# Altium footprint library con-amp.PCBLIB: 295 footprints (part 7 of 19)
Each footprint in its own frame and in the unit in brackets; x right, y up, seen from the top. Pads: shape width x height; smd on the part's side, far side on the other; paste and mask are expansions set on the pad; w line width, h text height; cw(c..) or ccw(c..) is an arc to the next point about the centre after c.
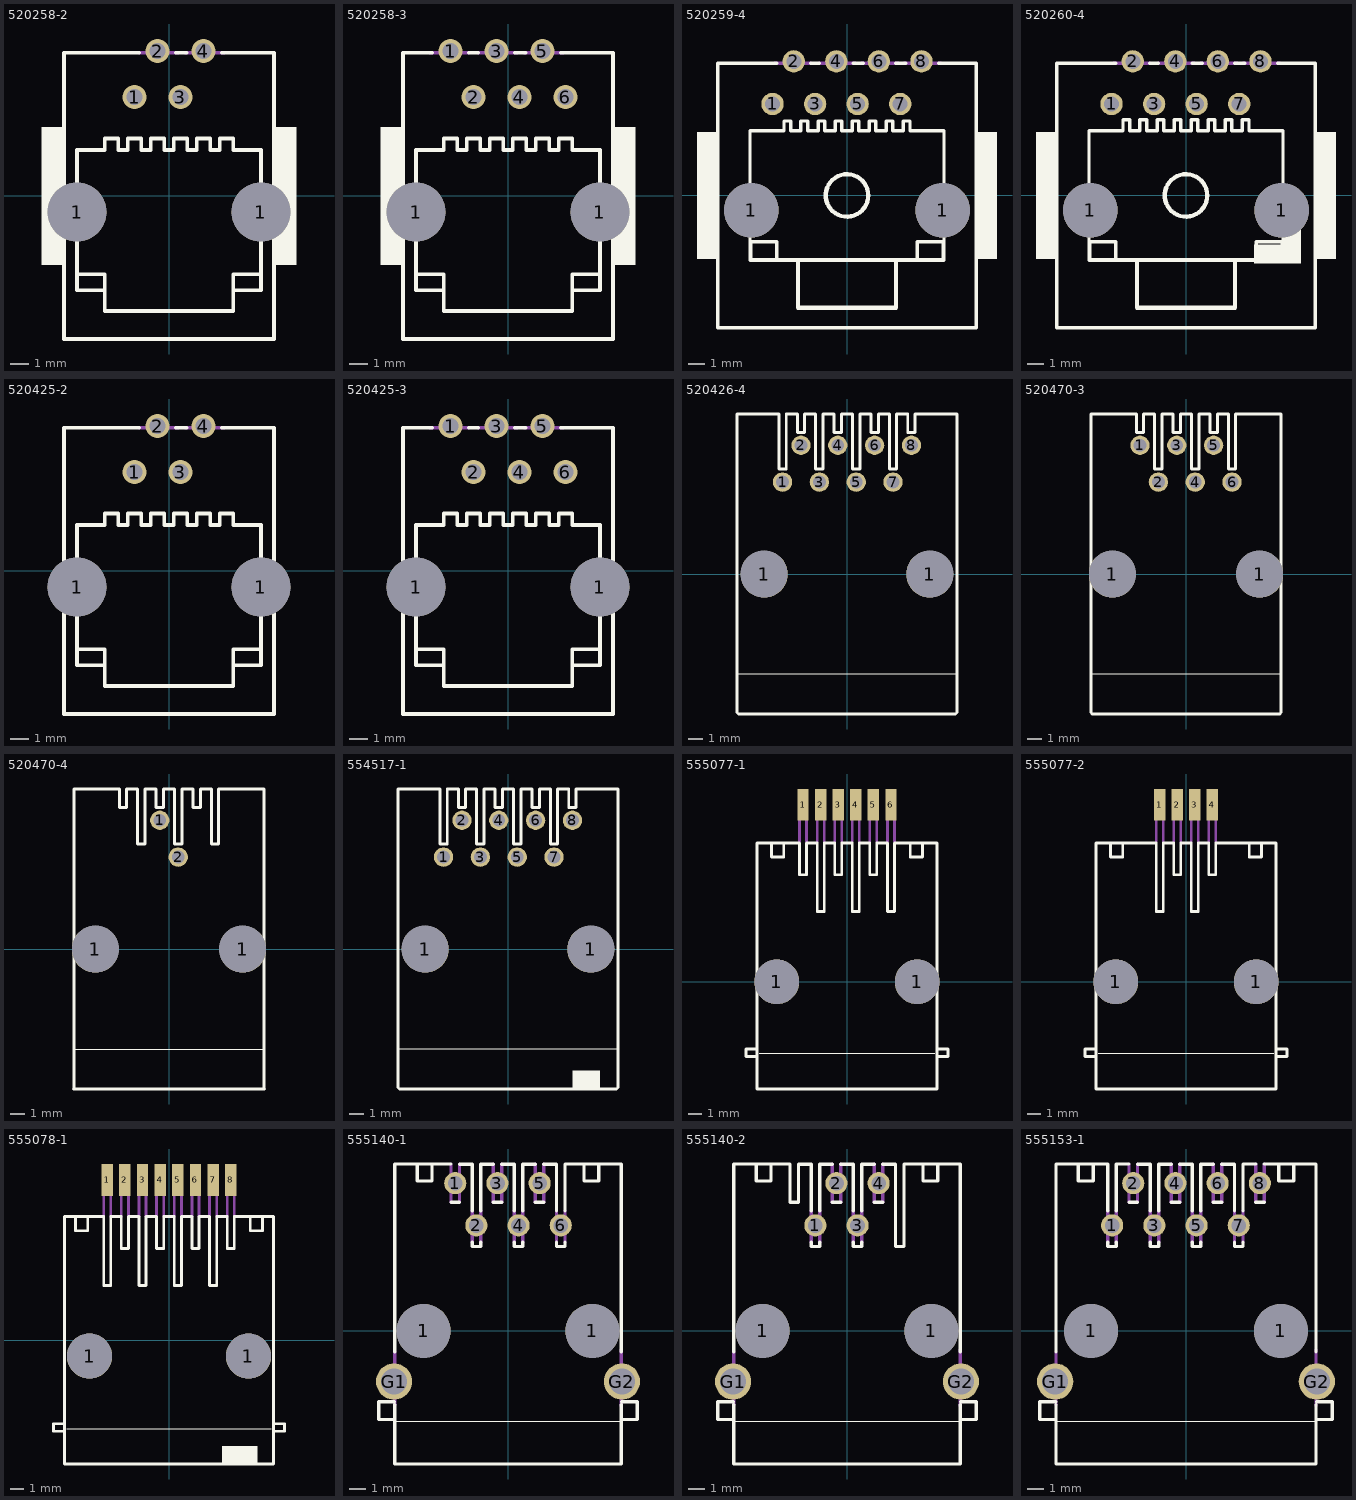
[diagram p6: the footprints below, top view; thin cyan lines are the x and y axes]

## 520258-2 [mil]
pads (6):
  round 128 hole 128: 1(-200,-35) 1(200,-35)
  round 52.5 hole 35: 1(-75,215) 2(-25,315) 3(25,215) 4(75,315)
Top Overlay:
  rectangle: -277.56,-149.61 -226.38,149.61
  rectangle: 226.38,-149.61 277.56,149.61
  lines w8: -65,311.02 -228.35,311.02 -228.35,-311.02 228.35,-311.02 228.35,311.02 115,311.02 ; 15,311.02 38.35,311.02 ; -200,-170 -200,100 -140,100 -140,125 -110,125 -110,100 -90,100 -90,125 -60,125 -60,100 -40,100 -40,125 -10,125 -10,100 10,100 10,125 40,125 40,100 60,100 60,125 90,125 90,100 110,100 110,125 140,125 140,100 200,100 200,-170 ; -200,-170 -200,-205 -140,-205 ; -200,-170 -140,-170 -140,-205 ; -140,-205 -140,-250 140,-250 140,-205 ; 140,-205 200,-205 200,-170 ; 140,-205 140,-170 200,-170
Mechanical 16:
  lines w8: -65,311.02 20,311.02 ; 35,311.02 120,311.02

## 520258-3 [mil]
pads (8):
  round 128 hole 128: 1(-200,-35) 1(200,-35)
  round 52.5 hole 35: 1(-125,315) 2(-75,215) 3(-25,315) 4(25,215) 5(75,315) 6(125,215)
Top Overlay:
  rectangle: -277.56,-149.61 -226.38,149.61
  rectangle: 226.38,-149.61 277.56,149.61
  lines w8: -165,311.02 -228.35,311.02 -228.35,-311.02 228.35,-311.02 228.35,311.02 115,311.02 ; -85,311.02 -65,311.02 ; 15,311.02 38.35,311.02 ; -200,-170 -200,100 -140,100 -140,125 -110,125 -110,100 -90,100 -90,125 -60,125 -60,100 -40,100 -40,125 -10,125 -10,100 10,100 10,125 40,125 40,100 60,100 60,125 90,125 90,100 110,100 110,125 140,125 140,100 200,100 200,-170 ; -200,-170 -200,-205 -140,-205 ; -200,-170 -140,-170 -140,-205 ; -140,-205 -140,-250 140,-250 140,-205 ; 140,-205 200,-205 200,-170 ; 140,-205 140,-170 200,-170
Mechanical 16:
  lines w8: -170,311.02 -85,311.02 ; -65,311.02 20,311.02 ; 35,311.02 120,311.02

## 520259-4 [mil]
pads (10):
  round 128 hole 128: 1(-225,-35) 1(225,-35)
  round 52.5 hole 35: 1(-175,215) 2(-125,315) 3(-75,215) 4(-25,315) 5(25,215) 6(75,315) 7(125,215) 8(175,315)
Top Overlay:
  circle w10: c0,0 r50
  rectangle: -352.56,-149.61 -301.38,149.61
  rectangle: 301.38,-149.61 352.56,149.61
  lines w8: -165,-152 -165,-109 -228,-109 -228,152 -148,152 -148,175 -132,175 -132,152 -109,152 -109,175 -92,175 -92,152 -68,152 -68,175 -52,175 -52,152 -28,152 -28,175 -12,175 -12,152 12,152 12,175 28,175 28,152 52,152 52,175 68,175 68,152 92,152 92,175 108,175 108,152 132,152 132,175 148,175 148,152 228,152 228,-109 165,-109 165,-152 ; -165,311.02 -303.35,311.02 -303.35,-311.02 303.35,-311.02 303.35,311.02 215,311.02 ; -85,311.02 -65,311.02 ; 15,311.02 38.35,311.02 ; 115,311.02 138.35,311.02
  lines w10: -227,-110 -227,-152 227,-152 227,-111 ; -115,-154 -115,-264 115,-264 115,-154
Mechanical 16:
  lines w8: -170,311.02 -85,311.02 ; -65,311.02 20,311.02 ; 35,311.02 120,311.02 ; 135,311.02 220,311.02

## 520260-4 [mil]
pads (10):
  round 128 hole 128: 1(-225,-35) 1(225,-35)
  round 52.5 hole 35: 1(-175,215) 2(-125,315) 3(-75,215) 4(-25,315) 5(25,215) 6(75,315) 7(125,215) 8(175,315)
Top Overlay:
  circle w10: c0,0 r50
  rectangle: -352.56,-149.61 -301.38,149.61
  rectangle: 301.38,-149.61 352.56,149.61
  rectangle: 160,-160 230,-115
  rectangle: 225,-160 270,-70
  lines w8: -165,-152 -165,-109 -228,-109 -228,152 -148,152 -148,178 -132,178 -132,152 -109,152 -109,178 -92,178 -92,152 -68,152 -68,178 -52,178 -52,152 -28,152 -28,178 -12,178 -12,152 12,152 12,178 28,178 28,152 52,152 52,178 68,178 68,152 92,152 92,178 108,178 108,152 132,152 132,178 148,178 148,152 228,152 228,-109 165,-109 165,-152 ; -165,311.02 -303.35,311.02 -303.35,-311.02 303.35,-311.02 303.35,311.02 215,311.02 ; -85,311.02 -65,311.02 ; 15,311.02 38.35,311.02 ; 115,311.02 138.35,311.02
  lines w10: -227,-110 -227,-152 227,-152 227,-111 ; -115,-154 -115,-264 115,-264 115,-154
Mechanical 16:
  lines w8: -170,311.02 -85,311.02 ; -65,311.02 20,311.02 ; 35,311.02 120,311.02 ; 135,311.02 220,311.02

## 520425-2 [mil]
pads (6):
  round 128 hole 128: 1(-200,-35) 1(200,-35)
  round 52.5 hole 35: 1(-75,215) 2(-25,315) 3(25,215) 4(75,315)
Top Overlay:
  lines w8: -65,311.02 -228.35,311.02 -228.35,-311.02 228.35,-311.02 228.35,311.02 115,311.02 ; 15,311.02 38.35,311.02 ; -200,-170 -200,100 -140,100 -140,125 -110,125 -110,100 -90,100 -90,125 -60,125 -60,100 -40,100 -40,125 -10,125 -10,100 10,100 10,125 40,125 40,100 60,100 60,125 90,125 90,100 110,100 110,125 140,125 140,100 200,100 200,-170 ; -200,-170 -200,-205 -140,-205 ; -200,-170 -140,-170 -140,-205 ; -140,-205 -140,-250 140,-250 140,-205 ; 140,-205 200,-205 200,-170 ; 140,-205 140,-170 200,-170
Mechanical 16:
  lines w8: -65,311.02 20,311.02 ; 35,311.02 120,311.02

## 520425-3 [mil]
pads (8):
  round 128 hole 128: 1(-200,-35) 1(200,-35)
  round 52.5 hole 35: 1(-125,315) 2(-75,215) 3(-25,315) 4(25,215) 5(75,315) 6(125,215)
Top Overlay:
  lines w8: -165,311.02 -228.35,311.02 -228.35,-311.02 228.35,-311.02 228.35,311.02 115,311.02 ; -85,311.02 -65,311.02 ; 15,311.02 38.35,311.02 ; -200,-170 -200,100 -140,100 -140,125 -110,125 -110,100 -90,100 -90,125 -60,125 -60,100 -40,100 -40,125 -10,125 -10,100 10,100 10,125 40,125 40,100 60,100 60,125 90,125 90,100 110,100 110,125 140,125 140,100 200,100 200,-170 ; -200,-170 -200,-205 -140,-205 ; -200,-170 -140,-170 -140,-205 ; -140,-205 -140,-250 140,-250 140,-205 ; 140,-205 200,-205 200,-170 ; 140,-205 140,-170 200,-170
Mechanical 16:
  lines w8: -170,311.02 -85,311.02 ; -65,311.02 20,311.02 ; 35,311.02 120,311.02

## 520426-4 [mil]
pads (10):
  round 128 hole 128: 1(-225,0) 1(225,0)
  round 52.5 hole 35: 1(-175,250) 2(-125,350) 3(-75,250) 4(-25,350) 5(25,250) 6(75,350) 7(125,250) 8(175,350)
Top Overlay:
  lines w2: -297.5,-272.5 297.5,-272.5
  lines w8: -298.35,-375.51 -298.35,434.8 -185,435 -185,285 -165,285 -165,434.8 ; -295,-380 295,-380 ; -165,435 -165,434.8 ; -135,435 -135,434.8 ; 35,435 35,434.8 ; 65,434.8 35,434.8 ; 65,435 65,385 85,385 85,435 115,435 115,285 135,285 135,434.8 165,434.8 ; 135,435 165,435 165,385 185,385 185,434.8 ; 185,435 185,434.8 ; 298.35,-375.51 298.35,434.8 185,434.8 ; -165,434.8 -135,434.8 ; -135,434.8 -135,385 -115,385 -115,435 -85,435 -85,285 -65,285 -65,435 -35,435 -35,385 -15,385 -15,435 15,435 15,285 35,285 35,434.8

## 520470-3 [mil]
pads (8):
  round 128 hole 128: 1(-200,0) 1(200,0)
  round 52.5 hole 35: 1(-125,350) 2(-75,250) 3(-25,350) 4(25,250) 5(75,350) 6(125,250)
Top Overlay:
  lines w2: -257.5,-272.5 257.5,-272.5
  lines w8: -258.35,-375.51 -258.35,434.8 -135,435 -135,385 -115,385 -115,434.8 ; -255,-380 255,-380 ; -115,435 -115,434.8 ; -85,435 -85,434.8 ; 85,435 85,434.8 ; 115,434.8 85,434.8 ; 115,435 115,285 135,285 135,435 258.35,434.8 258.35,-375.51 ; -115,434.8 -85,434.8 ; -85,434.8 -85,285 -65,285 -65,435 -35,435 -35,385 -15,385 -15,435 15,435 15,285 35,285 35,435 65,435 65,385 85,385 85,434.8

## 520470-4 [mil]
pads (4):
  round 128 hole 128: 1(-200,0) 1(200,0)
  round 52.5 hole 35: 1(-25,350) 2(25,250)
Top Overlay:
  lines w2: -257.5,-272.5 257.5,-272.5
  lines w8: -260,-380 260,-380 ; -258.35,-375.51 -258.35,434.8 -135,435 -135,385 -115,385 -115,434.8 ; -115,435 -115,434.8 ; -85,435 -85,434.8 ; 85,435 85,434.8 ; 115,434.8 85,434.8 ; 115,435 115,285 135,285 135,435 258.35,434.8 258.35,-375.51 ; -115,434.8 -85,434.8 ; -85,434.8 -85,285 -65,285 -65,435 -35,435 -35,385 -15,385 -15,435 15,435 15,285 35,285 35,435 65,435 65,385 85,385 85,434.8

## 554517-1 [mil]
pads (10):
  round 128 hole 128: 1(-225,0) 1(225,0)
  round 52.5 hole 35: 1(-175,250) 2(-125,350) 3(-75,250) 4(-25,350) 5(25,250) 6(75,350) 7(125,250) 8(175,350)
Top Overlay:
  rectangle: 175,-380 250,-330
  lines w2: -297.5,-272.5 297.5,-272.5
  lines w8: -298.35,-375.51 -298.35,434.8 -185,435 -185,285 -165,285 -165,434.8 ; -295,-380 295,-380 ; -165,435 -165,434.8 ; 35,435 35,434.8 ; 65,434.8 35,434.8 ; 65,435 65,385 85,385 85,435 115,435 115,285 135,285 135,434.8 ; 165,434.8 135,434.8 ; 185,435 185,434.8 ; 298.35,-375.51 298.35,434.8 185,434.8 ; -165,434.8 -135,434.8 -135,385 -115,385 -115,435 -85,435 -85,285 -65,285 -65,435 -35,435 -35,385 -15,385 -15,435 15,435 15,285 35,285 35,434.8 ; 135,434.8 135,435 165,435 165,385 185,385 185,434.8

## 555077-1 [mil]
pads (8):
  round 128 hole 128: 1(-200,0) 1(200,0)
  rect 32x90 smd: 1(-125,504.06) 2(-75,504.06) 3(-25,504.06) 4(25,504.06) 5(75,504.06) 6(125,504.06)
Top Overlay:
  lines w2: -250,-203 250,-203
  lines w8: -261.81,-212.87 -287.4,-212.87 -287.4,-191.22 -259.84,-191.22 ; -215,395 -215,355 -180,355 -180,395 ; -65,395 -35,395 -35,305 -15,305 -15,395 15,395 15,200 35,200 35,395.39 ; -65,395.39 -65,200 -85,200 -85,395 -115,395 -115,305 -135,305 -135,395.39 -255.91,395.39 -255.91,-305.39 255.91,-305.39 255.91,395.39 135,395.39 135,200 115,200 115,395 85,395 85,305 65,305 65,395 35,395 ; 180,395 180,355 215,355 215,395 ; 259.84,-191.22 287.4,-191.22 287.4,-212.87 261.81,-212.87
Mechanical 16:
  lines w8: -135,400 -135,544.06 -115,544.06 -115,400 ; -85,400 -85,544.06 -65,544.06 -65,400 ; -35.28,544.06 -35,544.06 ; -35,400 -35,544.06 ; -15,400 -15,544.06 -35,544.06 ; 15,400 15,544.06 35,544.06 35,400 ; 65,400 65,544.06 85,544.06 85,400 ; 115,400 115,544.06 135,544.06 135,400

## 555077-2 [mil]
pads (6):
  round 128 hole 128: 1(-200,0) 1(200,0)
  rect 32x90 smd: 1(-75,504.06) 2(-25,504.06) 3(25,504.06) 4(75,504.06)
Top Overlay:
  lines w2: -250,-203 250,-203
  lines w8: -261.81,-212.87 -287.4,-212.87 -287.4,-191.22 -259.84,-191.22 ; -215,395 -215,355 -180,355 -180,395 ; -85,395 -85,200 -65,200 -65,395.39 ; -85,395.39 -255.91,395.39 -255.91,-305.39 255.91,-305.39 255.91,395.39 85,395.39 ; -65,395 -35,395 -35,305 -15,305 -15,395 15,395 15,200 35,200 35,395.39 ; 35,395 65,395 65,305 85,305 85,395 ; 180,395 180,355 215,355 215,395 ; 259.84,-191.22 287.4,-191.22 287.4,-212.87 261.81,-212.87
Mechanical 16:
  lines w8: -85,400 -85,544.06 -65,544.06 -65,400 ; -35,400 -35,544.06 -15,544.06 -15,400 ; 15,400 15,544.06 35,544.06 35,400 ; 65,400 65,544.06 85,544.06 85,400

## 555078-1 [mil]
pads (10):
  round 128 hole 128: 1(-225,-45) 1(225,-45)
  rect 32x90 smd: 1(-175,454.06) 2(-125,454.06) 3(-75,454.06) 4(-25,454.06) 5(25,454.06) 6(75,454.06) 7(125,454.06) 8(175,454.06)
Top Overlay:
  rectangle: 150,-350 250,-300
  lines w2: -290,-250 290,-250
  lines w8: -301.81,-257.87 -327.4,-257.87 -327.4,-236.22 -299.84,-236.22 ; -265,350 -265,310 -230,310 -230,350 ; -185,350 -185,155 -165,155 -165,350.39 ; -185,350.39 -295.91,350.39 -295.91,-350.39 295.91,-350.39 295.91,350.39 185,350.39 ; -165,350 -135,350 -135,260 -115,260 -115,350 -85,350 -85,155 -65,155 -65,350.39 ; -65,350 -35,350 -35,260 -15,260 -15,350 15,350 15,155 35,155 35,350 65,350 65,260 85,260 85,350 115,350 115,155 135,155 135,350.39 ; 135,350 165,350 165,260 185,260 185,350 ; 230,350 230,310 265,310 265,350 ; 299.84,-236.22 327.4,-236.22 327.4,-257.87 301.81,-257.87
Mechanical 16:
  lines w8: -185,350 -185,494.06 -165,494.06 -165,350 ; -135,350 -135,494.06 -115,494.06 -115,350 ; -85,350 -85,494.06 -65,494.06 -65,350 ; -35,350 -35,494.06 -15,494.06 -15,350 ; 15,350 15,494.06 35,494.06 35,350 ; 65,350 65,494.06 85,494.06 85,350 ; 115,350 115,494.06 135,494.06 135,350 ; 165,350 165,494.06 185,494.06 185,350

## 555140-1 [mil]
pads (10):
  round 128 hole 128: 1(-200,0) 1(200,0)
  round 52.5 hole 35: 1(-125,350) 2(-75,250) 3(-25,350) 4(25,250) 5(75,350) 6(125,250)
  round 86 hole 62: G1(-270,-120) G2(270,-120)
Top Overlay:
  lines w2: -270,-214 270,-214
  lines w8: -268.86,-168.23 -306.42,-168.23 -306.42,-209.88 -268.82,-209.88 ; -267.91,-175 -267.91,-315.39 267.91,-315.39 267.91,-175 ; -267.91,-50 -267.91,395.39 -135,395.39 ; -215,395 -215,355 -180,355 -180,395 ; -135,305 -115,305 ; -115,395 -85,395 -85,285 ; -85,210 -85,200 -65,200 -65,210 ; -65,285 -65,395.39 ; -65,395 -35,395 ; -35,305 -15,305 ; -15,395 15,395 15,285 ; 15,210 15,200 35,200 35,210 ; 35,285 35,395.39 ; 35,395 65,395 ; 65,305 85,305 ; 85,395 115,395 115,285 ; 115,210 115,200 135,200 135,210 ; 135,285 135,395.39 267.91,395.39 267.91,-50 ; 180,395 180,355 215,355 215,395 ; 269.8,-209.88 306.42,-209.88 306.42,-168.23 269.84,-168.23
Mechanical 16:
  lines w8: -268,-175 -268,-50 ; -135,305 -135,395.39 ; -115,305 -115,395 ; -85,210 -85,285 ; -65,210 -65,285 ; -35,305 -35,395 ; -15,305 -15,395 ; 15,210 15,285 ; 35,210 35,285 ; 65,305 65,395 ; 85,305 85,395 ; 115,210 115,285 ; 135,210 135,285 ; 268,-177 268,-45

## 555140-2 [mil]
pads (8):
  round 128 hole 128: 1(-200,0) 1(200,0)
  round 52.5 hole 35: 1(-75,250) 2(-25,350) 3(25,250) 4(75,350)
  round 86 hole 62: G1(-270,-120) G2(270,-120)
Top Overlay:
  lines w2: -270,-214 270,-214
  lines w8: -268.86,-168.23 -306.42,-168.23 -306.42,-209.88 -268.82,-209.88 ; -267.91,-175 -267.91,-315.39 267.91,-315.39 267.91,-175 ; -267.91,-50 -267.91,395.39 -135,395.39 -135,305 -115,305 -115,395 -85,395 -85,285 ; -215,395 -215,355 -180,355 -180,395 ; -85,210 -85,200 -65,200 -65,210 ; -65,285 -65,395.39 ; -65,395 -35,395 ; -35,305 -15,305 ; -15,395 15,395 15,285 ; 15,210 15,200 35,200 35,210 ; 35,285 35,395.39 ; 35,395 65,395 ; 65,305 85,305 ; 85,395 115,395 115,200 135,200 135,395.39 267.91,395.39 267.91,-50 ; 180,395 180,355 215,355 215,395 ; 269.8,-209.88 306.42,-209.88 306.42,-168.23 269.84,-168.23
Mechanical 16:
  lines w8: -268,-175 -268,-50 ; -85,210 -85,285 ; -65,210 -65,285 ; -35,305 -35,395 ; -15,305 -15,395 ; 15,210 15,285 ; 35,210 35,285 ; 65,305 65,395 ; 85,305 85,395 ; 268,-177 268,-45

## 555153-1 [mil]
pads (12):
  round 128 hole 128: 1(-225,0) 1(225,0)
  round 52.5 hole 35: 1(-175,250) 2(-125,350) 3(-75,250) 4(-25,350) 5(25,250) 6(75,350) 7(125,250) 8(175,350)
  round 86 hole 62: G1(-310,-120) G2(310,-120)
Top Overlay:
  lines w2: -310,-214 310,-214
  lines w8: -308.86,-168.23 -346.42,-168.23 -346.42,-209.88 -308.82,-209.88 ; -307.91,-175 -307.91,-315.39 307.91,-315.39 307.91,-175 ; -307.91,-50 -307.91,395.39 -185,395.39 ; -255,395 -255,355 -220,355 -220,395 ; -185,210 -185,200 -165,200 -165,210 ; -185,285 -185,395 ; -165,285 -165,395.39 -135,395.39 ; -135,305 -115,305 ; -115,395 -85,395 -85,285 ; -85,210 -85,200 -65,200 -65,210 ; -65,285 -65,395.39 ; -65,395 -35,395 ; -35,305 -15,305 ; -15,395 15,395 15,285 ; 15,210 15,200 35,200 35,210 ; 35,285 35,395.39 ; 35,395 65,395 ; 65,305 85,305 ; 85,395 115,395 115,285 ; 115,210 115,200 135,200 135,210 ; 135,285 135,395.39 165,395.39 ; 165,305 185,305 ; 185,395.39 307.91,395.39 307.91,-50 ; 220,395 220,355 255,355 255,395 ; 309.8,-209.88 346.42,-209.88 346.42,-168.23 309.84,-168.23
Mechanical 16:
  lines w8: -308,-175 -308,-50 ; -185,210 -185,285 ; -165,210 -165,285 ; -135,305 -135,395.39 ; -115,305 -115,395 ; -85,210 -85,285 ; -65,210 -65,285 ; -35,305 -35,395 ; -15,305 -15,395 ; 15,210 15,285 ; 35,210 35,285 ; 65,305 65,395 ; 85,305 85,395 ; 115,210 115,285 ; 135,210 135,285 ; 165,305 165,395.39 ; 185,305 185,395 ; 308,-177 308,-45